# Altium footprint library PCB_PASSIVE.PcbLib: 100 footprints (part 6 of 7)
Each footprint in its own frame and in the unit in brackets; x right, y up, seen from the top. Pads: shape width x height; smd on the part's side, far side on the other; paste and mask are expansions set on the pad; w line width, h text height; cw(c..) or ccw(c..) is an arc to the next point about the centre after c.
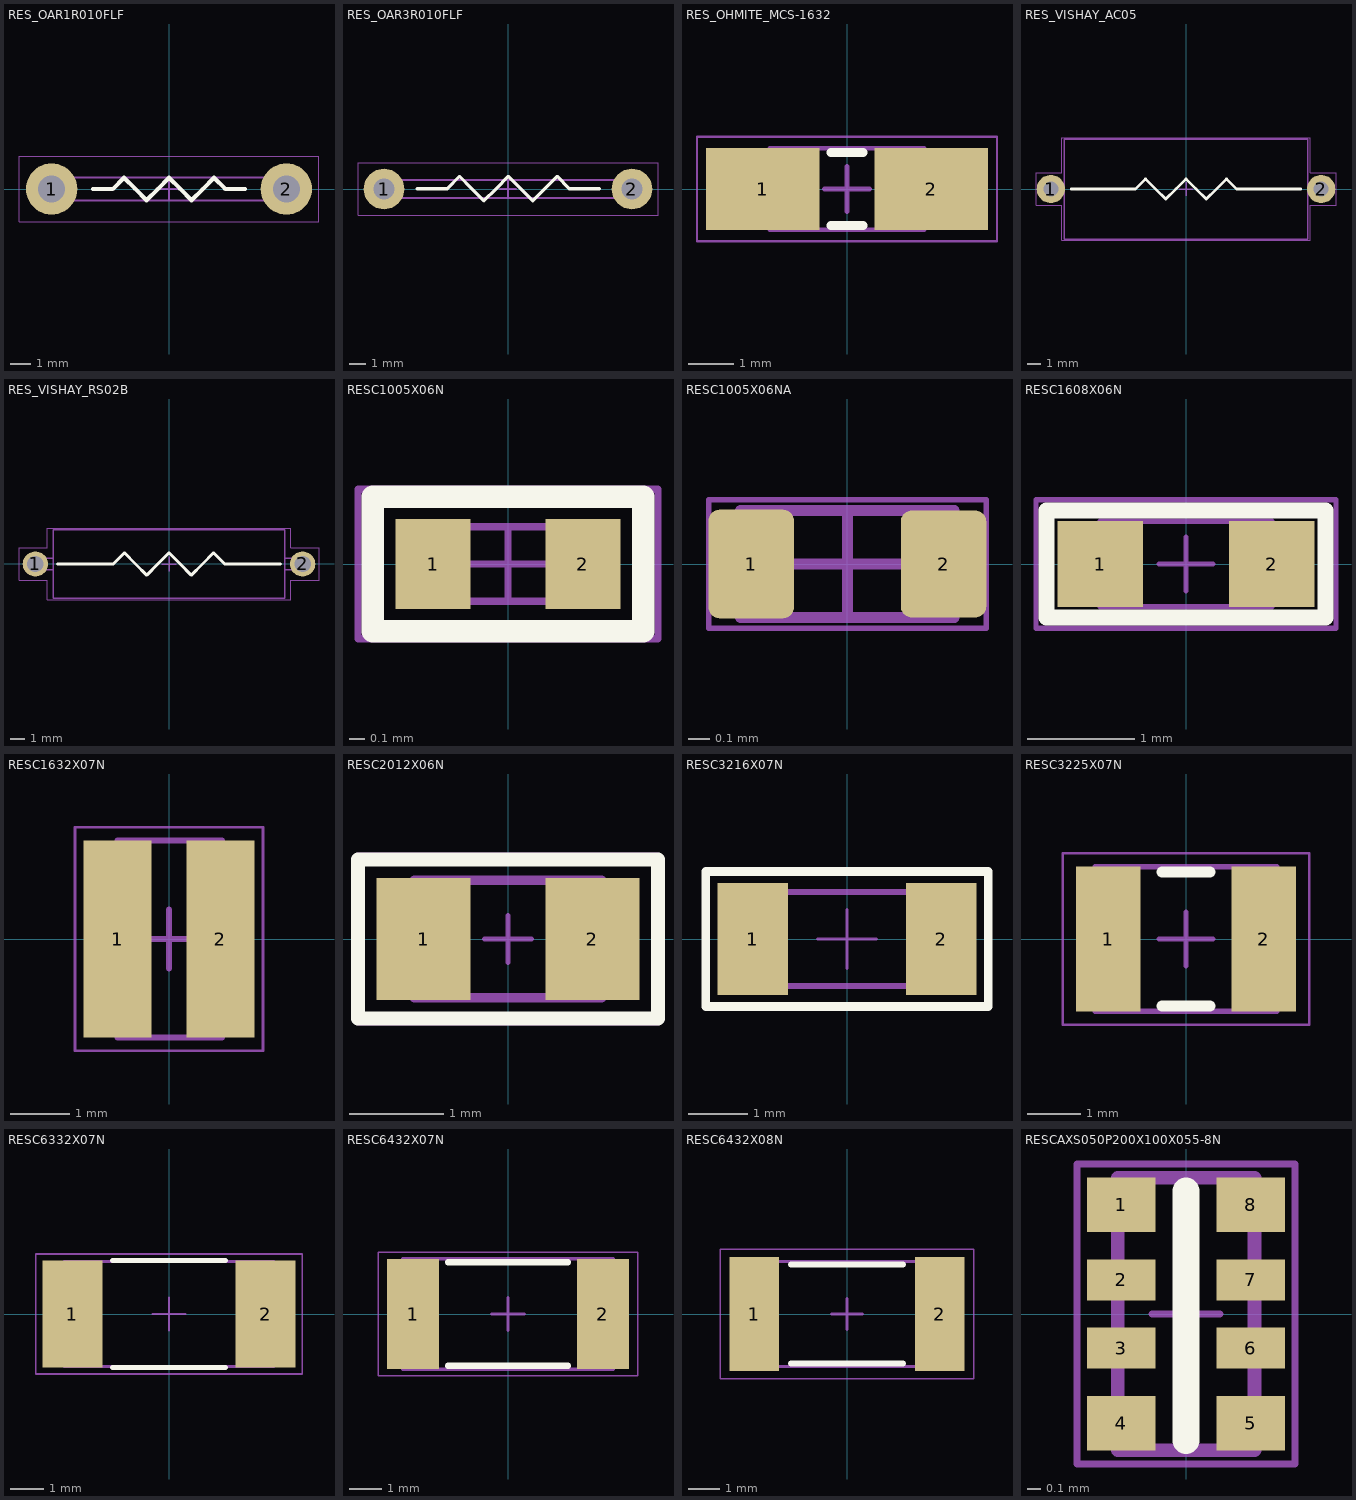
[diagram p5: the footprints below, top view; thin cyan lines are the x and y axes]

## RES_OAR1R010FLF [mm] "Resistor, 1W 0R01 1%"
height 8.2
pads (2):
  round 2.5 hole 1.3: 1(-5.715,0) 2(5.715,0)
Top Overlay:
  lines w0.2: -3.7,0 -2.735,0 -2.187,0.547 -1.64,0 -1.092,-0.547 -0.545,0 0.002,0.547 0.55,0 1.097,-0.547 1.645,0 2.192,0.547 2.74,0 3.705,0
Mechanical 11:
  text ".Designator" at -3,-0.4 h1
Mechanical 14:
  lines w0.1: -5.725,-0.55 5.715,-0.55 ccw(c5.715,0) 5.715,0.55 -5.725,0.55 ; -5.715,-0.55 cw(c-5.715,0) -5.715,0.55
Mechanical 15:
  lines w0.05: -7.3,-1.6 -7.3,1.6 7.3,1.6 7.3,-1.6 -7.3,-1.6
  lines w0.1: -0.5,0 0.5,0 ; 0,-0.5 0,0.5
3D body: height 8.2, standoff 0, extent -7.165,-1.45 7.185,1.45

## RES_OAR3R010FLF [mm] "Current sense (metal element)"
height 23.4
pads (2):
  round 2.5 hole 1.3: 1(-7.62,0) 2(7.62,0)
Top Overlay:
  lines w0.2: -5.58,0.02 -3.73,0.02 -2.98,0.77 -2.23,0.02 -1.48,-0.73 -0.73,0.02 0.02,0.77 0.77,0.02 1.52,-0.73 2.27,0.02 3.02,0.77 3.77,0.02 5.62,0.02
Mechanical 11:
  text ".Designator" at -3.43,-0.4 h1
Mechanical 14:
  lines w0.1: -7.63,-0.55 7.62,-0.55 ccw(c7.62,0) 7.62,0.55 -7.63,0.55 ; -7.62,-0.55 cw(c-7.62,0) -7.62,0.55
Mechanical 15:
  lines w0.05: -9.22,-1.6 -9.22,1.6 9.22,1.6 9.22,-1.6 -9.22,-1.6
  lines w0.1: -0.5,0 0.5,0 ; 0,-0.5 0,0.5
3D body: height 23.4, standoff 0, extent -9.07,-1.45 9.08,1.45

## RES_OHMITE_MCS-1632 [mm]
height 0.6
pads (2):
  rect 2.5x1.8 smd: 1(-1.85,0) 2(1.85,0)
Top Overlay:
  lines w0.2: -0.35,-0.8 0.35,-0.8 ; -0.35,0.8 0.35,0.8
Mechanical 11:
  text ".Designator" at -0.8,1.5 h1
Mechanical 14:
  lines w0.1: -1.7,-0.9 -1.7,0.9 1.7,0.9 1.7,-0.9 -1.7,-0.9
Mechanical 15:
  lines w0.05: -3.3,-1.15 -3.3,1.15 3.3,1.15 3.3,-1.15 -3.3,-1.15
  lines w0.1: -0.5,0 0.5,0 ; 0,-0.5 0,0.5
3D body "mizuvan.step": height 0.62, standoff 0, extent -1.7,-0.9 1.7,0.9

## RES_VISHAY_AC05 [mm] "Vishay 5W RES"
height 15.5
pads (2):
  round 2.1 hole 1.1: 1(-10,0) 2(10,0)
Top Overlay:
  lines w0.2: -8.5,0 -3.75,0 -3,0.75 -2.25,0 -1.5,-0.75 -0.75,0 0,0.75 0.75,0 1.5,-0.75 2.25,0 3,0.75 3.75,0 8.5,0
Mechanical 11:
  text ".Designator" at -4.15,-1.55 h1
Mechanical 14:
  circle w0.1: c-10,0 r0.4
  circle w0.1: c10,0 r0.4
  lines w0.1: -10,-0.4 -9,-0.4 ; -10,0.4 -9,0.4 ; 9,-0.4 10,-0.4 ; 9,0.4 10,0.4 ; -9,-3.7 -0.05,-3.7 9,-3.7 9,3.7 -0.25,3.7 -9,3.7 -9,-3.7
Mechanical 15:
  lines w0.05: -11.1,-1.2 -11.1,0 -11.1,1.2 -9.2,1.2 -9.2,3.8 9.2,3.8 9.2,1.2 11.1,1.2 11.1,0 11.1,-1.2 9.2,-1.2 9.2,-3.8 -9.2,-3.8 -9.2,-1.2 -11.1,-1.2
  lines w0.1: -0.5,0 0.5,0 ; 0,-0.5 0,0.5
3D body "User Library-Resistor_PTH_AC05_Vishay_5W.STEP": height 7.5, standoff -2.6, extent -10.4,-3.743 10.4,3.743

## RES_VISHAY_RS02B [mm] "3W wirewound resistor"
height 5
pads (2):
  round 1.7 hole 1.1: 1(-9,0) 2(9,0)
Top Overlay:
  lines w0.2: -7.5,0 -3.75,0 -3,0.75 -2.25,0 -1.5,-0.75 -0.75,0 0,0.75 0.75,0 1.5,-0.75 2.25,0 3,0.75 3.75,0 7.5,0
Mechanical 11:
  text ".Designator" at -4.25,-0.35 h1
Mechanical 14:
  circle w0.1: c-9,0 r0.4
  circle w0.1: c9,0 r0.4
  lines w0.1: -9,-0.4 -7.8,-0.4 ; -9,0.4 -7.8,0.4 ; 7.8,-0.4 9,-0.4 ; 7.8,0.4 9,0.4 ; -7.8,-2.3 7.8,-2.3 7.8,2.3 -7.8,2.3 -7.8,-2.3
Mechanical 15:
  lines w0.05: -10.1,-1.1 -8.2,-1.1 -8.2,-2.4 8.2,-2.4 8.2,-1.1 10.1,-1.1 10.1,0 10.1,1.1 8.2,1.1 8.2,2.4 -8.2,2.4 -8.2,1.1 -10.1,1.1 -10.1,0 -10.1,-1.1
  lines w0.1: -0.5,0 0.5,0 ; 0,-0.5 0,0.5
3D body: height 5.23, standoff 0.47, extent -7.85,-2.37 7.85,2.374

## RESC1005X06N [mm] "Chip Resistor, 2-Leads, Body 1,00x0,50mm, IPC Low Density"
height 0.6
pads (2):
  rect 0.5x0.6 smd mask+0.05: 1(-0.5,0) 2(0.5,0)
Top Overlay:
  lines w0.15: -0.9,-0.45 -0.9,0.45 0.9,0.45 0.9,-0.45 -0.9,-0.45
Mechanical 11:
  text ".Designator" at -0.9,0.7 h0.3
Mechanical 14:
  lines w0.05: -0.3,-0.25 -0.3,0.25 ; 0.3,-0.25 0.3,0.25 ; -0.5,-0.25 0.5,-0.25 0.5,0.25 -0.5,0.25 -0.5,-0.25
Mechanical 15:
  lines w0.05: -0.25,0 0.25,0 ; 0,-0.25 0,0.25 ; -1,-0.5 1,-0.5 1,0.5 -1,0.5 -1,-0.5
3D body "0402rES.step": height 0.41, standoff 0, extent -0.575,-0.275 0.575,0.275

## RESC1005X06NA [mm] "Chip Resistor, 2-Leads, Body 1,00x0,50mm, IPC Low Density"
pads (2):
  rrect25% 0.4x0.508 smd: 1(-0.45,0)
  rrect25% 0.4x0.5 smd: 2(0.45,0)
Mechanical 11:
  text ".Designator" at -0.7,0.5 h0.3
Mechanical 14:
  lines w0.05: -0.3,-0.25 -0.3,0.25 ; 0.3,-0.25 0.3,0.25 ; -0.5,-0.25 -0.5,0.25 0.5,0.25 0.5,-0.25 -0.5,-0.25
Mechanical 15:
  lines w0.025: -0.65,-0.3 0.65,-0.3 0.65,0.3 -0.65,0.3 -0.65,-0.3
  lines w0.05: -0.25,0 0.25,0 ; 0,-0.25 0,0.25
3D body "C0402.STEP": height 0.51, standoff 0, extent -0.508,-0.254 0.508,0.254

## RESC1608X06N [mm] "Chip Resistor, 2-Leads, Body 1,60x0,80mm, IPC Low Density"
height 0.6
pads (2):
  rect 0.8x0.8 smd mask+0.05: 1(-0.8,0) 2(0.8,0)
Top Overlay:
  lines w0.15: -1.3,-0.5 -1.3,0.5 1.3,0.5 1.3,-0.5 -1.3,-0.5
Mechanical 11:
  text ".Designator" at -1.3,0.8 h0.3
Mechanical 14:
  lines w0.05: -0.6,-0.4 -0.6,0.4 ; 0.6,-0.4 0.6,0.4 ; -0.8,-0.4 0.8,-0.4 0.8,0.4 -0.8,0.4 -0.8,-0.4
Mechanical 15:
  lines w0.05: -0.25,0 0.25,0 ; 0,-0.25 0,0.25 ; -1.4,-0.6 1.4,-0.6 1.4,0.6 -1.4,0.6 -1.4,-0.6
3D body "0603rES.step": height 0.45, standoff 0, extent -0.775,-0.425 0.775,0.425

## RESC1632X07N [mm] "Chip Resistor, 2-Leads, Body 1,60x3,20mm, IPC Medium Density"
height 0.65
pads (2):
  rect 1.15x3.35 smd: 1(-0.875,0) 2(0.875,0)
Mechanical 11:
  text ".Designator" at -1.1,0 h0.3
Mechanical 14:
  lines w0.1: -0.7,-1.675 -0.7,1.675 ; 0.7,-1.675 0.7,1.675 ; -0.875,-1.675 -0.875,1.675 0.9,1.675 0.9,-1.675 -0.875,-1.675
Mechanical 15:
  lines w0.05: -1.6,-1.9 -1.6,1.9 1.6,1.9 1.6,-1.9 -1.6,-1.9
  lines w0.1: -0.5,0 0.5,0 ; 0,-0.5 0,0.5
3D body "User Library-wk732b.STEP": height 0.62, standoff 0.01, extent -0.8,-1.6 0.8,1.6

## RESC2012X06N [mm] "Chip Resistor, 2-Leads, Body 2,00x1,25mm, IPC Low Density"
height 0.6
pads (2):
  rect 1x1.3 smd: 1(-0.9,0) 2(0.9,0)
Top Overlay:
  lines w0.15: -1.6,-0.85 1.6,-0.85 1.6,0.85 -1.6,0.85 -1.6,-0.85
Mechanical 11:
  text ".Designator" at -1.5,1.1 h0.3
Mechanical 14:
  lines w0.1: -0.6,-0.625 -0.6,0.625 ; 0.6,-0.625 0.6,0.625 ; -1,-0.625 -1,0.625 1,0.625 1,-0.625 -1,-0.625
Mechanical 15:
  lines w0.05: -0.25,0 0.25,0 ; 0,-0.25 0,0.25 ; -1.6,-0.9 1.6,-0.9 1.6,0.9 -1.6,0.9 -1.6,-0.9
3D body "0805rES.step": height 0.45, standoff 0, extent -1,-0.625 1,0.625

## RESC3216X07N [mm] "Chip Resistor, 2-Leads, Body 3,10x1,60mm, IPC Low Density"
height 0.65
pads (2):
  rect 1.2x1.9 smd: 1(-1.6,0) 2(1.6,0)
Top Overlay:
  lines w0.15: -2.4,-1.15 -2.4,1.15 2.4,1.15 2.4,-1.15 -2.4,-1.15
Mechanical 11:
  text ".Designator" at -2.2,1.5 h0.3
Mechanical 14:
  lines w0.1: -1.2,-0.8 -1.2,0.8 ; 1.2,-0.8 1.2,0.8 ; -1.6,-0.8 1.6,-0.8 1.6,0.8 -1.6,0.8 -1.6,-0.8
Mechanical 15:
  lines w0.05: -0.5,0 0.5,0 ; 0,-0.5 0,0.5 ; -2.4,-1.1 -2.4,1.1 2.4,1.1 2.4,-1.1 -2.4,-1.1
3D body "1206RES.step": height 0.85, standoff 0, extent -1.675,-0.865 1.675,0.865

## RESC3225X07N [mm] "Chip Resistor, 2-Leads, Body 3,20x2,50mm, IPC Medium Density"
height 0.6
pads (2):
  rect 1.2x2.7 smd: 1(-1.45,0) 2(1.45,0)
Top Overlay:
  lines w0.2: -0.45,-1.25 0.45,-1.25 ; -0.45,1.25 0.45,1.25
Mechanical 11:
  text ".Designator" at -0.9,0 h0.3
Mechanical 14:
  lines w0.1: -1.2,-1.35 -1.2,1.35 ; 1.2,-1.35 1.2,1.35 ; -1.7,-1.35 -1.7,1.35 1.7,1.35 1.7,-1.35 -1.7,-1.35
Mechanical 15:
  lines w0.05: -2.3,-1.6 -2.3,1.6 2.3,1.6 2.3,-1.6 -2.3,-1.6
  lines w0.1: -0.5,0 0.5,0 ; 0,-0.5 0,0.5
3D body "User Library-RESC3225X06N.STEP": height 0.55, standoff 0, extent -1.6,-1.25 1.6,1.25

## RESC6332X07N [mm] "Chip Resistor, 2-Leads, Body 6,30x3,20mm, IPC Low Density"
height 0.7
pads (2):
  rect 1.8x3.2 smd: 1(-2.9,0) 2(2.9,0)
Top Overlay:
  lines w0.15: -1.7,-1.6 1.7,-1.6 ; -1.7,1.6 1.7,1.6
Mechanical 11:
  text ".Designator" at -3.7,2.1 h0.3
Mechanical 14:
  lines w0.1: -2.5,-1.575 -2.5,1.575 ; 2.5,-1.575 2.5,1.575 ; -3.15,-1.575 3.15,-1.575 3.15,1.575 -3.15,1.575 -3.15,-1.575
Mechanical 15:
  lines w0.05: -0.5,0 0.5,0 ; 0,-0.5 0,0.5 ; -4,-1.8 -4,1.8 4,1.8 4,-1.8 -4,-1.8
3D body "User Library-2512 SMD Resistor.STEP": height 1.6, standoff 0, extent -3.194,-1.5 3.156,1.5

## RESC6432X07N [mm] "Chip Resistor, 2-Leads, Body 6,30x3,20mm, IPC Medium Density"
height 0.65
pads (2):
  rect 1.6x3.4 smd: 1(-2.925,0) 2(2.925,0)
Top Overlay:
  lines w0.2: -1.85,-1.6 1.85,-1.6 ; -1.85,1.6 1.85,1.6
Mechanical 11:
  text ".Designator" at -2.5,-0.3 h1
Mechanical 14:
  lines w0.1: -2.5,-1.7 -2.5,1.7 ; 2.5,-1.7 2.5,1.7 ; -3.25,-1.7 3.25,-1.7 3.25,1.7 -3.25,1.7 -3.25,-1.7
Mechanical 15:
  lines w0.05: -4,-1.9 4,-1.9 4,1.9 -4,1.9 -4,-1.9
  lines w0.1: -0.5,0 0.5,0 ; 0,-0.5 0,0.5
3D body "User Library-RESC6432X06.STEP": height 0.6, standoff 0, extent -3.2,-1.6 3.2,1.6

## RESC6432X08N [mm] "Chip Resistor, 2-Leads, Body 6,40x3,20mm, IPC Medium Density"
height 0.75
pads (2):
  rect 1.6x3.7 smd: 1(-3,0) 2(3,0)
Top Overlay:
  lines w0.2: -1.8,-1.6 1.8,-1.6 ; -1.8,1.6 1.8,1.6
Mechanical 11:
  text ".Designator" at -2.6,-0.5 h1
Mechanical 14:
  lines w0.1: -3.3,-1.7 3.3,-1.7 3.3,1.7 -3.3,1.7 -3.3,-1.7
Mechanical 15:
  lines w0.05: -4.1,-2.1 4.1,-2.1 4.1,2.1 -4.1,2.1 -4.1,-2.1
  lines w0.1: -0.5,0 0.5,0 ; 0,-0.5 0,0.5
3D body "RESC6432X08N.step": height 0.75, standoff 0, extent -3.3,-1.7 3.3,1.7

## RESCAXS050P200X100X055-8N [mm] "hip Array, ConvexS, 8-Leads, Pitch 0,50mm,  Body 2,0x1,0mm,  IPC Medium Density"
height 0.5
pads (8):
  rect 0.5x0.4 smd: 1(-0.475,0.8) 4(-0.475,-0.8) 5(0.475,-0.8) 8(0.475,0.8)
  rect 0.5x0.3 smd: 2(-0.475,0.25) 3(-0.475,-0.25) 6(0.475,-0.25) 7(0.475,0.25)
Top Overlay:
  lines w0.2: 0,-0.925 0,0.9
Mechanical 11:
  text ".Designator" at -0.3,0.1 h0.3
Mechanical 14:
  lines w0.1: -0.5,-1 -0.5,1 0.502,1 0.502,-1 -0.5,-1
Mechanical 15:
  lines w0.05: -0.25,0 0.25,0 ; 0,-0.25 0,0.25 ; -0.8,-1.1 -0.8,1.1 0.8,1.1 0.8,-1.1 -0.8,-1.1
3D body "User Library-741C083.STEP": height 0.35, standoff -0.03, extent -0.502,-1 0.502,1